# Altium footprint library SILICA_PCBLIB.PcbLib: 161 footprints (part 2 of 11)
Each footprint in its own frame and in the unit in brackets; x right, y up, seen from the top. Pads: shape width x height; smd on the part's side, far side on the other; paste and mask are expansions set on the pad; w line width, h text height; cw(c..) or ccw(c..) is an arc to the next point about the centre after c.
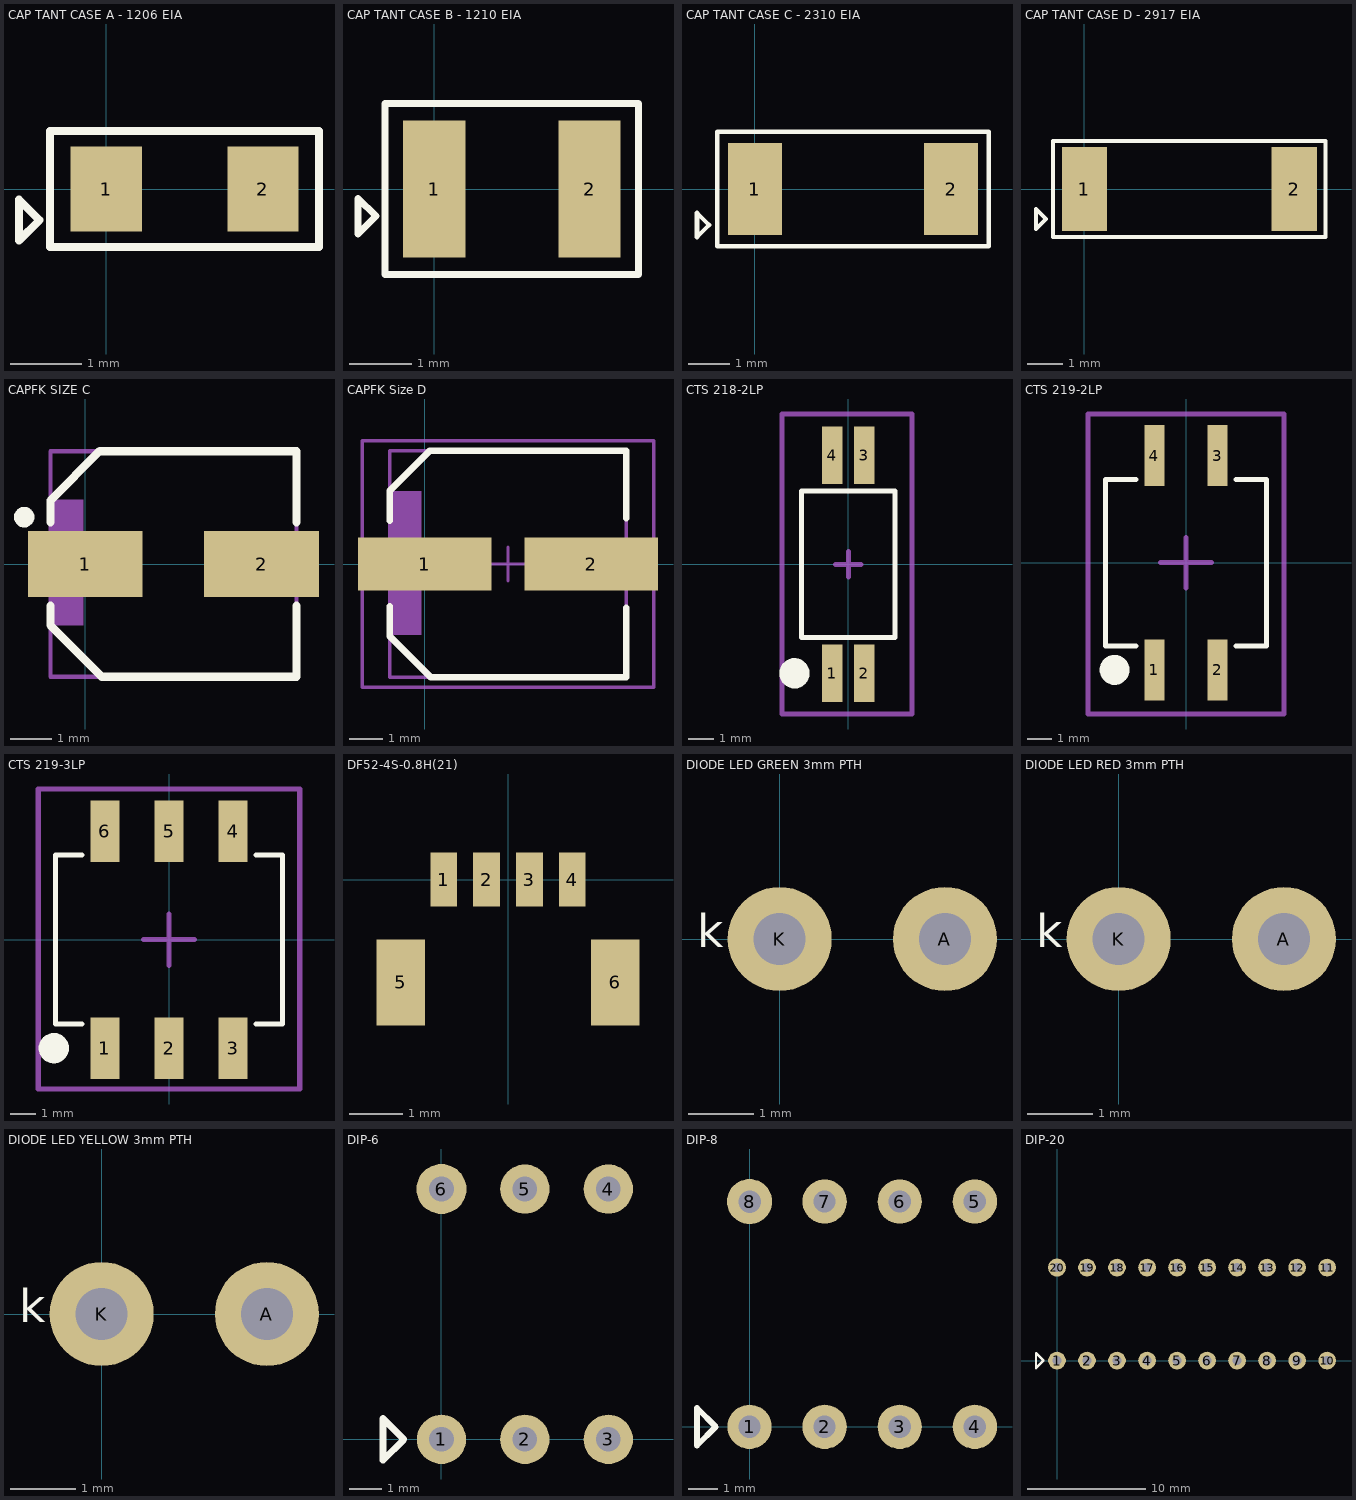
[diagram p1: the footprints below, top view; thin cyan lines are the x and y axes]

## CAP TANT CASE A - 1206 EIA [mm] "KEMET SERIES"
pads (2):
  rect 1x1.2 smd: 1(0,0) 2(2.2,0)
Top Overlay:
  lines w0.112: -1.225,-0.725 -0.937,-0.437 -1.225,-0.15 -1.225,-0.725 ; -0.787,-0.813 -0.787,0.813 2.987,0.813 2.987,-0.813 -0.787,-0.813

## CAP TANT CASE B - 1210 EIA [mm] "KEMET SERIES"
pads (2):
  rect 1x2.2 smd: 1(0,0) 2(2.5,0)
Top Overlay:
  lines w0.112: -1.225,-0.725 -0.937,-0.437 -1.225,-0.15 -1.225,-0.725 ; -0.787,-1.375 3.287,-1.375 3.287,1.375 -0.787,1.375 -0.787,-1.375

## CAP TANT CASE C - 2310 EIA [mm] "AVX SERIES"
pads (2):
  rect 1.3x2.2 smd: 1(0,0) 2(4.7,0)
Top Overlay:
  lines w0.112: -1.388,-1.15 -1.388,-0.575 -1.1,-0.863 -1.388,-1.15 ; -0.9,-1.375 5.6,-1.375 5.6,1.375 -0.9,1.375 -0.9,-1.375

## CAP TANT CASE D - 2917 EIA [mm] "AVX SERIES"
pads (2):
  rect 1.3x2.4 smd: 1(0,0) 2(6,0)
Top Overlay:
  lines w0.112: -1.388,-1.15 -1.1,-0.863 -1.388,-0.575 -1.388,-1.15 ; -0.9,-1.375 -0.9,1.375 6.9,1.375 6.9,-1.375 -0.9,-1.375

## CAPFK SIZE C [mm]
height 6.1
pads (2):
  rect 2.8x1.6 smd paste-0.051 mask+0: 1(0,0) 2(4.3,0)
Top Overlay:
  circle w0.25: c-1.489,1.143 r0.125
  lines w0.2: -0.85,-1.016 -0.85,-1.496 0.404,-2.75 5.15,-2.75 5.15,-1.016 ; -0.85,1.016 -0.85,1.547 0.353,2.75 5.15,2.75 5.15,1.016
Mechanical 13:
  rectangle: -0.85,-1.499 -0.043,1.575
  lines w0.1: -0.85,-2.75 -0.85,2.75 5.15,2.75 5.15,-2.75 -0.85,-2.75
3D body "SW3dPS-capacitor size C.STEP": height 5.41, standoff -0.01, extent -0.8,-2.65 5.1,2.65

## CAPFK Size D [mm] "Aluminum Electrolytic Capacitors / Surface Mount Type / Series: FK Type: V"
height 6.1
pads (2):
  rect 4x1.6 smd paste-0.051 mask+0: 1(0,0) 2(5,0)
Top Overlay:
  lines w0.2: -1.05,-1.27 -1.05,-2.165 0.185,-3.4 6.05,-3.4 6.05,-1.321 ; -1.05,1.295 -1.05,2.191 0.16,3.4 6.05,3.4 6.05,1.372
Mechanical 13:
  rectangle: -1.05,-2.133 -0.095,2.185
  lines w0.1: -1.05,-3.4 -1.05,3.4 6.05,3.4 6.05,-3.4 -1.05,-3.4
Mechanical 15:
  lines w0.1: 2,0 3,0 ; 2.5,-0.5 2.5,0.5 ; -1.875,-3.7 6.875,-3.7 6.875,3.7 -1.875,3.7 -1.875,-3.7
3D body "SW3dPS-capacitor size D.STEP": height 5.41, standoff -0.01, extent -1,-3.3 6,3.3

## CTS 218-2LP [mm] "Half Pitch, SMD DIP Switch"
pads (4):
  rect 0.8x2.27 smd paste-0.025 mask+0: 1(-0.635,-4.31) 2(0.635,-4.31) 3(0.635,4.31) 4(-0.635,4.31)
Top Overlay:
  circle w0.6: c-2.129,-4.31 r0.3
  lines w0.2: -1.855,-2.9 1.855,-2.9 1.855,2.9 -1.855,2.9 -1.855,-2.9
Mechanical 15:
  lines w0.2: -0.508,0 0.508,0 ; 0,-0.508 0,0.508 ; -2.616,-5.918 -2.616,5.944 2.515,5.944 2.515,-5.918 -2.616,-5.918
3D body "218-2polesLP.STP": height 2.77, standoff 0.15, extent -1.855,-4.22 1.855,4.22

## CTS 219-2LP [mm] "SMD DIP Switch"
pads (4):
  rect 0.8x2.44 smd paste-0.025 mask+0: 1(-1.27,-4.3) 2(1.27,-4.3) 3(1.27,4.3) 4(-1.27,4.3)
Top Overlay:
  circle w0.6: c-2.865,-4.3 r0.3
  lines w0.2: -2,-3.35 -3.225,-3.35 -3.225,3.35 -2,3.35 ; 2,-3.35 3.225,-3.35 3.225,3.35 2,3.35
Mechanical 15:
  lines w0.2: -1.016,0 1.016,0 ; 0,-1.016 0,1.016 ; -3.937,-6.071 -3.937,5.969 3.937,5.969 3.937,-6.071 -3.937,-6.071
3D body "219-2poles.STP": height 4.28, standoff -0.02, extent -3.275,-4.955 3.275,4.955

## CTS 219-3LP [mm] "SMD DIP Switch"
pads (6):
  rect 1.143x2.44 smd paste-0.025 mask+0: 1(-2.54,-4.3) 2(0,-4.3) 3(2.54,-4.3) 4(2.54,4.3) 5(0,4.3) 6(-2.54,4.3)
Top Overlay:
  circle w0.6: c-4.567,-4.3 r0.3
  lines w0.2: -3.44,-3.35 -4.495,-3.35 -4.495,3.35 -3.44,3.35 ; 3.44,-3.35 4.495,-3.35 4.495,3.35 3.44,3.35
Mechanical 15:
  lines w0.2: -1.016,0 0,0 ; 0,-1.016 0,0 ; 0,1.016 0,0 ; 1.016,0 0,0 ; -5.182,-5.918 -5.182,5.969 5.182,5.969 5.182,-5.918 -5.182,-5.918
3D body "219-3poles.STP": height 4.48, standoff 0.18, extent -4.532,-4.968 4.558,4.942

## DF52-4S-0.8H(21) [mm]
pads (6):
  rect 0.5x1 smd: 1(-1.2,0) 2(-0.4,0) 3(0.4,0) 4(1.2,0)
  rect 0.9x1.6 smd: 5(-2,-1.92) 6(2,-1.92)
3D body "DF52-4S-0.8H.stp": height 1.75, standoff 0, extent -2.7,-2.77 2.7,0

## DIODE LED GREEN 3mm PTH [mm]
pads (2):
  round 1.6 hole 0.8: A(2.54,0) K(0,0)
Top Overlay:
  text "k" at -1.27,-0.127 h0.51
3D body "User Library-LED 3MM verde.STEP": height 5.8, standoff -3.3, extent -0.254,-1.995 3.296,1.995

## DIODE LED RED 3mm PTH [mm]
pads (2):
  round 1.6 hole 0.8: A(2.54,0) K(0,0)
Top Overlay:
  text "k" at -1.27,-0.127 h0.51
3D body "User Library-LED_d3-RED.STEP": height 4.98, standoff -2.5, extent -0.279,-1.644 2.934,1.653

## DIODE LED YELLOW 3mm PTH [mm]
pads (2):
  round 1.6 hole 0.8: A(2.54,0) K(0,0)
Top Overlay:
  text "k" at -1.27,-0.127 h0.51
3D body "User Library-LA 3366_s.STEP": height 26.8, standoff -6.8, extent -0.43,-1.651 2.97,1.749

## DIP-6 [mm] "OPTO"
pads (6):
  round 1.5 hole 0.75: 1(0,0) 2(2.54,0) 3(5.08,0) 4(5.08,7.62) 5(2.54,7.62)
  round 1.524 hole 0.762: 6(0,7.62)
Top Overlay:
  lines w0.2: -1.778,-0.635 -1.143,0 -1.778,0.635 -1.778,-0.635
3D body "User Library-DIP6-White.STEP": height 4.4, standoff -2.9, extent -0.889,0.129 6.231,7.999

## DIP-8 [mm]
pads (8):
  round 1.5 hole 0.75: 1(0,0) 2(2.54,0) 3(5.08,0) 4(7.62,0) 5(7.62,7.62) 6(5.08,7.62) 7(2.54,7.62)
  round 1.524 hole 0.762: 8(0,7.62)
Top Overlay:
  lines w0.2: -1.778,-0.635 -1.143,0 -1.778,0.635 -1.778,-0.635

## DIP-20 [mm]
pads (20):
  round 1.5 hole 0.75: 1(0,0) 2(2.54,0) 3(5.08,0) 4(7.62,0) 5(10.16,0) 6(12.7,0) 7(15.24,0) 8(17.78,0) 9(20.32,0) 10(22.86,0) 11(22.86,7.87) 12(20.32,7.87) 13(17.78,7.87) 14(15.24,7.87) 15(12.7,7.87) 16(10.16,7.87) 17(7.62,7.87) 18(5.08,7.87) 19(2.54,7.87)
  round 1.524 hole 0.762: 20(0,7.87)
Top Overlay:
  lines w0.2: -1.778,-0.635 -1.778,0.635 -1.143,0 -1.778,-0.635